# Altium footprint library ST封装.PcbLib: 1336 footprints (part 99 of 109)
Each footprint in its own frame and in the unit in brackets; x right, y up, seen from the top. Pads: shape width x height; smd on the part's side, far side on the other; paste and mask are expansions set on the pad; w line width, h text height; cw(c..) or ccw(c..) is an arc to the next point about the centre after c.
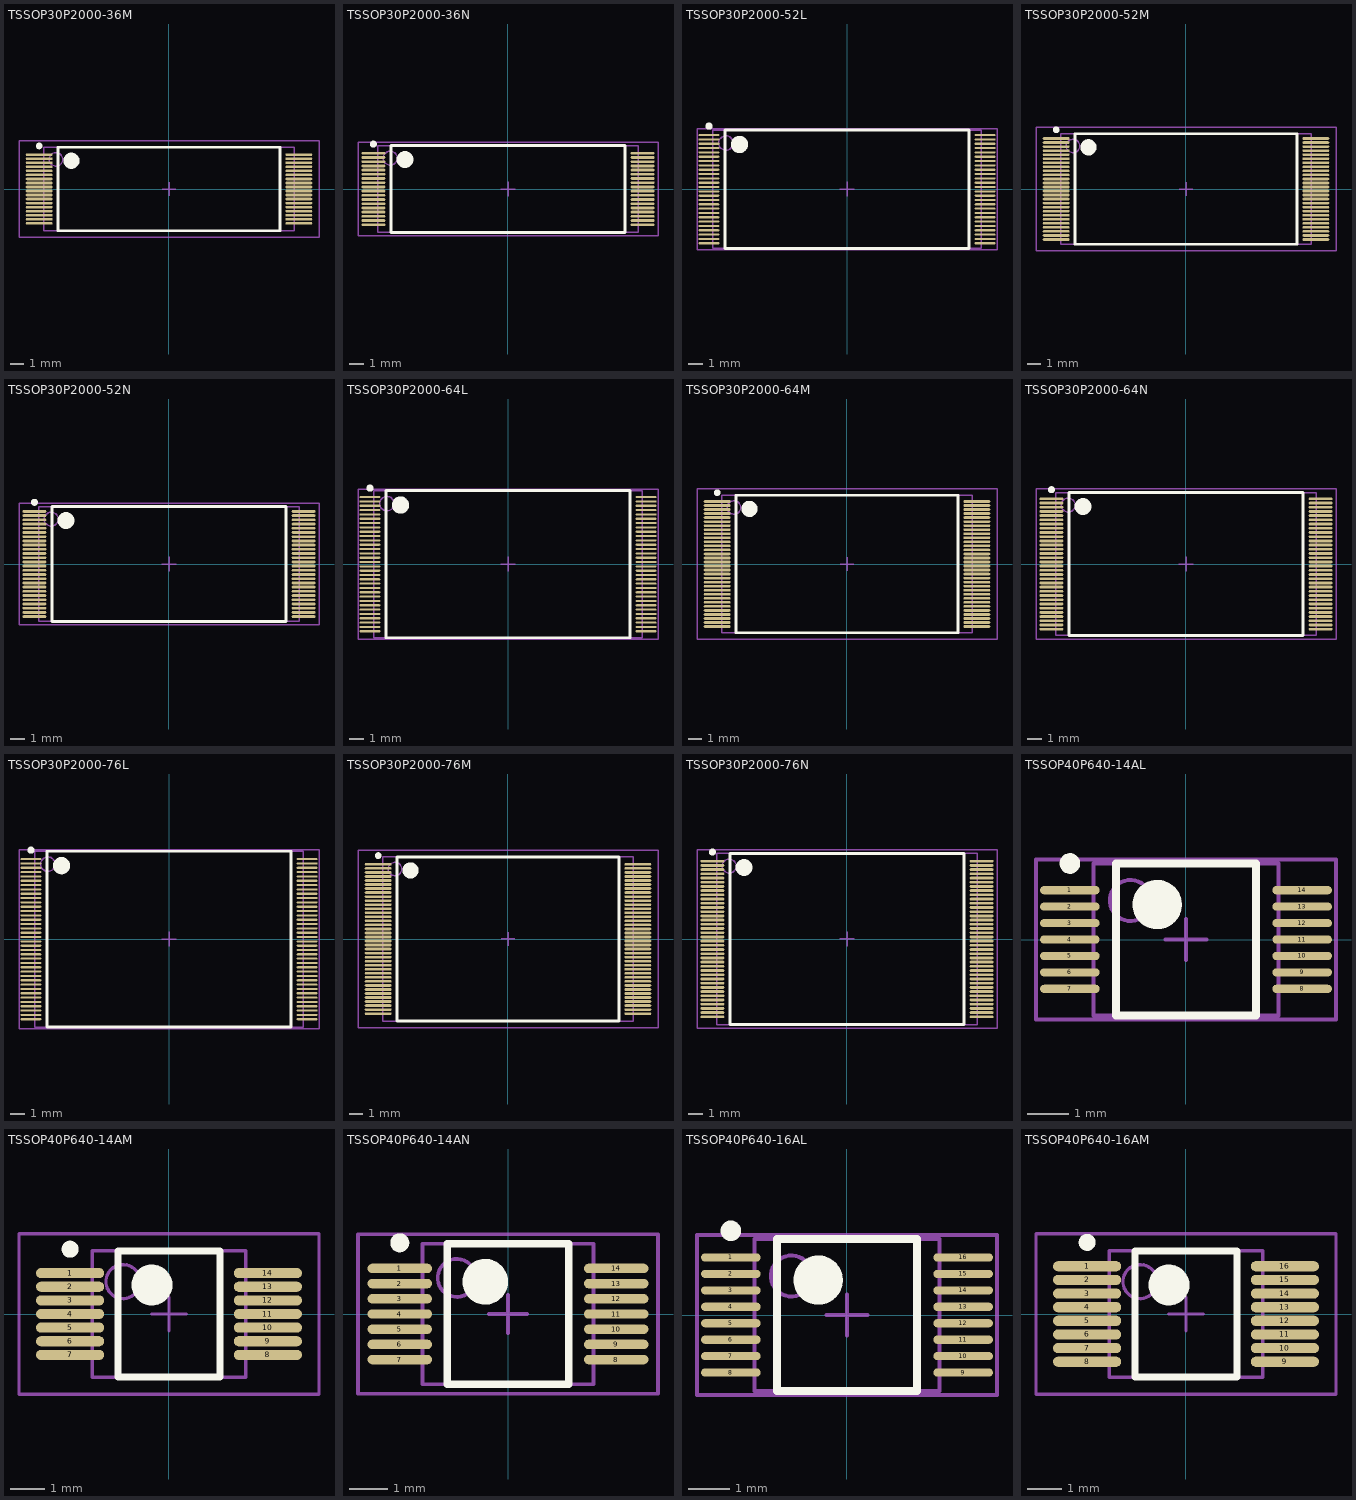
[diagram p98: the footprints below, top view; thin cyan lines are the x and y axes]

## TSSOP30P2000-36M [mm] "TSSOP, 36-Leads, Body 6.2x18.6mm; Pitch 0.3mm, IPC Low Density"
height 1.27
pads (36):
  oval 2x0.2 smd: 1(-9.65,2.55) 2(-9.65,2.25) 3(-9.65,1.95) 4(-9.65,1.65) 5(-9.65,1.35) 6(-9.65,1.05) 7(-9.65,0.75) 8(-9.65,0.45) 9(-9.65,0.15) 10(-9.65,-0.15) 11(-9.65,-0.45) 12(-9.65,-0.75) 13(-9.65,-1.05) 14(-9.65,-1.35) 15(-9.65,-1.65) 16(-9.65,-1.95) 17(-9.65,-2.25) 18(-9.65,-2.55) 19(9.65,-2.55) 20(9.65,-2.25) 21(9.65,-1.95) 22(9.65,-1.65) 23(9.65,-1.35) 24(9.65,-1.05) 25(9.65,-0.75) 26(9.65,-0.45) 27(9.65,-0.15) 28(9.65,0.15) 29(9.65,0.45) 30(9.65,0.75) 31(9.65,1.05) 32(9.65,1.35) 33(9.65,1.65) 34(9.65,1.95) 35(9.65,2.25) 36(9.65,2.55)
Top Overlay:
  circle w0.6: c-7.25,2.1 r0.3
  circle w0.25: c-9.65,3.2 r0.125
  lines w0.2: -8.25,-3.1 8.25,-3.1 8.25,3.1 -8.25,3.1 -8.25,-3.1
Mechanical 13:
  circle w0.1: c-8.4,2.2 r0.5
  lines w0.1: -9.3,-3.1 9.3,-3.1 9.3,3.1 -9.3,3.1 -9.3,-3.1
Mechanical 15:
  lines w0.1: -0.5,0 0.5,0 ; 0,-0.5 0,0.5 ; -11.15,-3.6 11.15,-3.6 11.15,3.6 -11.15,3.6 -11.15,-3.6
3D body: height 1.27, standoff 0, extent -9.3,-3.1 9.3,3.1

## TSSOP30P2000-36N [mm] "TSSOP, 36-Leads, Body 6.2x18.6mm; Pitch 0.3mm, IPC Medium Density"
height 1.27
pads (36):
  oval 1.7x0.2 smd: 1(-9.6,2.55) 2(-9.6,2.25) 3(-9.6,1.95) 4(-9.6,1.65) 5(-9.6,1.35) 6(-9.6,1.05) 7(-9.6,0.75) 8(-9.6,0.45) 9(-9.6,0.15) 10(-9.6,-0.15) 11(-9.6,-0.45) 12(-9.6,-0.75) 13(-9.6,-1.05) 14(-9.6,-1.35) 15(-9.6,-1.65) 16(-9.6,-1.95) 17(-9.6,-2.25) 18(-9.6,-2.55) 19(9.6,-2.55) 20(9.6,-2.25) 21(9.6,-1.95) 22(9.6,-1.65) 23(9.6,-1.35) 24(9.6,-1.05) 25(9.6,-0.75) 26(9.6,-0.45) 27(9.6,-0.15) 28(9.6,0.15) 29(9.6,0.45) 30(9.6,0.75) 31(9.6,1.05) 32(9.6,1.35) 33(9.6,1.65) 34(9.6,1.95) 35(9.6,2.25) 36(9.6,2.55)
Top Overlay:
  circle w0.25: c-9.6,3.2 r0.125
  circle w0.6: c-7.35,2.1 r0.3
  lines w0.2: -8.35,-3.1 -8.35,3.1 8.35,3.1 8.35,-3.1 -8.35,-3.1
Mechanical 13:
  circle w0.1: c-8.4,2.2 r0.5
  lines w0.1: -9.3,-3.1 -9.3,3.1 9.3,3.1 9.3,-3.1 -9.3,-3.1
Mechanical 15:
  lines w0.1: -0.5,0 0.5,0 ; 0,-0.5 0,0.5 ; -10.7,-3.35 -10.7,3.35 10.7,3.35 10.7,-3.35 -10.7,-3.35
3D body: height 1.27, standoff 0, extent -9.3,-3.1 9.3,3.1

## TSSOP30P2000-52L [mm] "TSSOP, 52-Leads, Body 8.2x18.6mm; Pitch 0.3mm, IPC High Density"
height 1.27
pads (52):
  oval 1.45x0.15 smd: 1(-9.575,3.75) 2(-9.575,3.45) 3(-9.575,3.15) 4(-9.575,2.85) 5(-9.575,2.55) 6(-9.575,2.25) 7(-9.575,1.95) 8(-9.575,1.65) 9(-9.575,1.35) 10(-9.575,1.05) 11(-9.575,0.75) 12(-9.575,0.45) 13(-9.575,0.15) 14(-9.575,-0.15) 15(-9.575,-0.45) 16(-9.575,-0.75) 17(-9.575,-1.05) 18(-9.575,-1.35) 19(-9.575,-1.65) 20(-9.575,-1.95) 21(-9.575,-2.25) 22(-9.575,-2.55) 23(-9.575,-2.85) 24(-9.575,-3.15) 25(-9.575,-3.45) 26(-9.575,-3.75) 27(9.575,-3.75) 28(9.575,-3.45) 29(9.575,-3.15) 30(9.575,-2.85) 31(9.575,-2.55) 32(9.575,-2.25) 33(9.575,-1.95) 34(9.575,-1.65) 35(9.575,-1.35) 36(9.575,-1.05) 37(9.575,-0.75) 38(9.575,-0.45) 39(9.575,-0.15) 40(9.575,0.15) 41(9.575,0.45) 42(9.575,0.75) 43(9.575,1.05) 44(9.575,1.35) 45(9.575,1.65) 46(9.575,1.95) 47(9.575,2.25) 48(9.575,2.55) 49(9.575,2.85) 50(9.575,3.15) 51(9.575,3.45) 52(9.575,3.75)
Top Overlay:
  circle w0.6: c-7.45,3.1 r0.3
  circle w0.25: c-9.575,4.375 r0.125
  lines w0.2: -8.45,-4.1 8.45,-4.1 8.45,4.1 -8.45,4.1 -8.45,-4.1
Mechanical 13:
  circle w0.1: c-8.4,3.2 r0.5
  lines w0.1: -9.3,-4.1 9.3,-4.1 9.3,4.1 -9.3,4.1 -9.3,-4.1
Mechanical 15:
  lines w0.1: -0.5,0 0.5,0 ; 0,-0.5 0,0.5 ; -10.4,-4.2 10.4,-4.2 10.4,4.2 -10.4,4.2 -10.4,-4.2
3D body: height 1.27, standoff 0, extent -9.3,-4.1 9.3,4.1

## TSSOP30P2000-52M [mm] "TSSOP, 52-Leads, Body 8.2x18.6mm; Pitch 0.3mm, IPC Low Density"
height 1.27
pads (52):
  oval 2x0.2 smd: 1(-9.65,3.75) 2(-9.65,3.45) 3(-9.65,3.15) 4(-9.65,2.85) 5(-9.65,2.55) 6(-9.65,2.25) 7(-9.65,1.95) 8(-9.65,1.65) 9(-9.65,1.35) 10(-9.65,1.05) 11(-9.65,0.75) 12(-9.65,0.45) 13(-9.65,0.15) 14(-9.65,-0.15) 15(-9.65,-0.45) 16(-9.65,-0.75) 17(-9.65,-1.05) 18(-9.65,-1.35) 19(-9.65,-1.65) 20(-9.65,-1.95) 21(-9.65,-2.25) 22(-9.65,-2.55) 23(-9.65,-2.85) 24(-9.65,-3.15) 25(-9.65,-3.45) 26(-9.65,-3.75) 27(9.65,-3.75) 28(9.65,-3.45) 29(9.65,-3.15) 30(9.65,-2.85) 31(9.65,-2.55) 32(9.65,-2.25) 33(9.65,-1.95) 34(9.65,-1.65) 35(9.65,-1.35) 36(9.65,-1.05) 37(9.65,-0.75) 38(9.65,-0.45) 39(9.65,-0.15) 40(9.65,0.15) 41(9.65,0.45) 42(9.65,0.75) 43(9.65,1.05) 44(9.65,1.35) 45(9.65,1.65) 46(9.65,1.95) 47(9.65,2.25) 48(9.65,2.55) 49(9.65,2.85) 50(9.65,3.15) 51(9.65,3.45) 52(9.65,3.75)
Top Overlay:
  circle w0.6: c-7.25,3.1 r0.3
  circle w0.25: c-9.65,4.4 r0.125
  lines w0.2: -8.25,-4.1 8.25,-4.1 8.25,4.1 -8.25,4.1 -8.25,-4.1
Mechanical 13:
  circle w0.1: c-8.4,3.2 r0.5
  lines w0.1: -9.3,-4.1 9.3,-4.1 9.3,4.1 -9.3,4.1 -9.3,-4.1
Mechanical 15:
  lines w0.1: -0.5,0 0.5,0 ; 0,-0.5 0,0.5 ; -11.15,-4.6 11.15,-4.6 11.15,4.6 -11.15,4.6 -11.15,-4.6
3D body: height 1.27, standoff 0, extent -9.3,-4.1 9.3,4.1

## TSSOP30P2000-52N [mm] "TSSOP, 52-Leads, Body 8.2x18.6mm; Pitch 0.3mm, IPC Medium Density"
height 1.27
pads (52):
  oval 1.7x0.2 smd: 1(-9.6,3.75) 2(-9.6,3.45) 3(-9.6,3.15) 4(-9.6,2.85) 5(-9.6,2.55) 6(-9.6,2.25) 7(-9.6,1.95) 8(-9.6,1.65) 9(-9.6,1.35) 10(-9.6,1.05) 11(-9.6,0.75) 12(-9.6,0.45) 13(-9.6,0.15) 14(-9.6,-0.15) 15(-9.6,-0.45) 16(-9.6,-0.75) 17(-9.6,-1.05) 18(-9.6,-1.35) 19(-9.6,-1.65) 20(-9.6,-1.95) 21(-9.6,-2.25) 22(-9.6,-2.55) 23(-9.6,-2.85) 24(-9.6,-3.15) 25(-9.6,-3.45) 26(-9.6,-3.75) 27(9.6,-3.75) 28(9.6,-3.45) 29(9.6,-3.15) 30(9.6,-2.85) 31(9.6,-2.55) 32(9.6,-2.25) 33(9.6,-1.95) 34(9.6,-1.65) 35(9.6,-1.35) 36(9.6,-1.05) 37(9.6,-0.75) 38(9.6,-0.45) 39(9.6,-0.15) 40(9.6,0.15) 41(9.6,0.45) 42(9.6,0.75) 43(9.6,1.05) 44(9.6,1.35) 45(9.6,1.65) 46(9.6,1.95) 47(9.6,2.25) 48(9.6,2.55) 49(9.6,2.85) 50(9.6,3.15) 51(9.6,3.45) 52(9.6,3.75)
Top Overlay:
  circle w0.25: c-9.6,4.4 r0.125
  circle w0.6: c-7.35,3.1 r0.3
  lines w0.2: -8.35,-4.1 -8.35,4.1 8.35,4.1 8.35,-4.1 -8.35,-4.1
Mechanical 13:
  circle w0.1: c-8.4,3.2 r0.5
  lines w0.1: -9.3,-4.1 -9.3,4.1 9.3,4.1 9.3,-4.1 -9.3,-4.1
Mechanical 15:
  lines w0.1: -0.5,0 0.5,0 ; 0,-0.5 0,0.5 ; -10.7,-4.35 -10.7,4.35 10.7,4.35 10.7,-4.35 -10.7,-4.35
3D body: height 1.27, standoff 0, extent -9.3,-4.1 9.3,4.1

## TSSOP30P2000-64L [mm] "TSSOP, 64-Leads, Body 10.2x18.6mm; Pitch 0.3mm, IPC High Density"
height 1.27
pads (64):
  oval 1.45x0.15 smd: 1(-9.575,4.65) 2(-9.575,4.35) 3(-9.575,4.05) 4(-9.575,3.75) 5(-9.575,3.45) 6(-9.575,3.15) 7(-9.575,2.85) 8(-9.575,2.55) 9(-9.575,2.25) 10(-9.575,1.95) 11(-9.575,1.65) 12(-9.575,1.35) 13(-9.575,1.05) 14(-9.575,0.75) 15(-9.575,0.45) 16(-9.575,0.15) 17(-9.575,-0.15) 18(-9.575,-0.45) 19(-9.575,-0.75) 20(-9.575,-1.05) 21(-9.575,-1.35) 22(-9.575,-1.65) 23(-9.575,-1.95) 24(-9.575,-2.25) 25(-9.575,-2.55) 26(-9.575,-2.85) 27(-9.575,-3.15) 28(-9.575,-3.45) 29(-9.575,-3.75) 30(-9.575,-4.05) 31(-9.575,-4.35) 32(-9.575,-4.65) 33(9.575,-4.65) 34(9.575,-4.35) 35(9.575,-4.05) 36(9.575,-3.75) 37(9.575,-3.45) 38(9.575,-3.15) 39(9.575,-2.85) 40(9.575,-2.55) 41(9.575,-2.25) 42(9.575,-1.95) 43(9.575,-1.65) 44(9.575,-1.35) 45(9.575,-1.05) 46(9.575,-0.75) 47(9.575,-0.45) 48(9.575,-0.15) 49(9.575,0.15) 50(9.575,0.45) 51(9.575,0.75) 52(9.575,1.05) 53(9.575,1.35) 54(9.575,1.65) 55(9.575,1.95) 56(9.575,2.25) 57(9.575,2.55) 58(9.575,2.85) 59(9.575,3.15) 60(9.575,3.45) 61(9.575,3.75) 62(9.575,4.05) 63(9.575,4.35) 64(9.575,4.65)
Top Overlay:
  circle w0.25: c-9.575,5.275 r0.125
  circle w0.6: c-7.45,4.1 r0.3
  lines w0.2: -8.45,-5.1 -8.45,5.1 8.45,5.1 8.45,-5.1 -8.45,-5.1
Mechanical 13:
  circle w0.1: c-8.4,4.2 r0.5
  lines w0.1: -9.3,-5.1 -9.3,5.1 9.3,5.1 9.3,-5.1 -9.3,-5.1
Mechanical 15:
  lines w0.1: -0.5,0 0.5,0 ; 0,-0.5 0,0.5 ; -10.4,-5.2 -10.4,5.2 10.4,5.2 10.4,-5.2 -10.4,-5.2
3D body: height 1.27, standoff 0, extent -9.3,-5.1 9.3,5.1

## TSSOP30P2000-64M [mm] "TSSOP, 64-Leads, Body 10.2x18.6mm; Pitch 0.3mm, IPC Low Density"
height 1.27
pads (64):
  oval 2x0.2 smd: 1(-9.65,4.65) 2(-9.65,4.35) 3(-9.65,4.05) 4(-9.65,3.75) 5(-9.65,3.45) 6(-9.65,3.15) 7(-9.65,2.85) 8(-9.65,2.55) 9(-9.65,2.25) 10(-9.65,1.95) 11(-9.65,1.65) 12(-9.65,1.35) 13(-9.65,1.05) 14(-9.65,0.75) 15(-9.65,0.45) 16(-9.65,0.15) 17(-9.65,-0.15) 18(-9.65,-0.45) 19(-9.65,-0.75) 20(-9.65,-1.05) 21(-9.65,-1.35) 22(-9.65,-1.65) 23(-9.65,-1.95) 24(-9.65,-2.25) 25(-9.65,-2.55) 26(-9.65,-2.85) 27(-9.65,-3.15) 28(-9.65,-3.45) 29(-9.65,-3.75) 30(-9.65,-4.05) 31(-9.65,-4.35) 32(-9.65,-4.65) 33(9.65,-4.65) 34(9.65,-4.35) 35(9.65,-4.05) 36(9.65,-3.75) 37(9.65,-3.45) 38(9.65,-3.15) 39(9.65,-2.85) 40(9.65,-2.55) 41(9.65,-2.25) 42(9.65,-1.95) 43(9.65,-1.65) 44(9.65,-1.35) 45(9.65,-1.05) 46(9.65,-0.75) 47(9.65,-0.45) 48(9.65,-0.15) 49(9.65,0.15) 50(9.65,0.45) 51(9.65,0.75) 52(9.65,1.05) 53(9.65,1.35) 54(9.65,1.65) 55(9.65,1.95) 56(9.65,2.25) 57(9.65,2.55) 58(9.65,2.85) 59(9.65,3.15) 60(9.65,3.45) 61(9.65,3.75) 62(9.65,4.05) 63(9.65,4.35) 64(9.65,4.65)
Top Overlay:
  circle w0.6: c-7.25,4.1 r0.3
  circle w0.25: c-9.65,5.3 r0.125
  lines w0.2: -8.25,-5.1 8.25,-5.1 8.25,5.1 -8.25,5.1 -8.25,-5.1
Mechanical 13:
  circle w0.1: c-8.4,4.2 r0.5
  lines w0.1: -9.3,-5.1 9.3,-5.1 9.3,5.1 -9.3,5.1 -9.3,-5.1
Mechanical 15:
  lines w0.1: -0.5,0 0.5,0 ; 0,-0.5 0,0.5 ; -11.15,-5.6 11.15,-5.6 11.15,5.6 -11.15,5.6 -11.15,-5.6
3D body: height 1.27, standoff 0, extent -9.3,-5.1 9.3,5.1

## TSSOP30P2000-64N [mm] "TSSOP, 64-Leads, Body 10.2x18.6mm; Pitch 0.3mm, IPC Medium Density"
height 1.27
pads (64):
  oval 1.7x0.2 smd: 1(-9.6,4.65) 2(-9.6,4.35) 3(-9.6,4.05) 4(-9.6,3.75) 5(-9.6,3.45) 6(-9.6,3.15) 7(-9.6,2.85) 8(-9.6,2.55) 9(-9.6,2.25) 10(-9.6,1.95) 11(-9.6,1.65) 12(-9.6,1.35) 13(-9.6,1.05) 14(-9.6,0.75) 15(-9.6,0.45) 16(-9.6,0.15) 17(-9.6,-0.15) 18(-9.6,-0.45) 19(-9.6,-0.75) 20(-9.6,-1.05) 21(-9.6,-1.35) 22(-9.6,-1.65) 23(-9.6,-1.95) 24(-9.6,-2.25) 25(-9.6,-2.55) 26(-9.6,-2.85) 27(-9.6,-3.15) 28(-9.6,-3.45) 29(-9.6,-3.75) 30(-9.6,-4.05) 31(-9.6,-4.35) 32(-9.6,-4.65) 33(9.6,-4.65) 34(9.6,-4.35) 35(9.6,-4.05) 36(9.6,-3.75) 37(9.6,-3.45) 38(9.6,-3.15) 39(9.6,-2.85) 40(9.6,-2.55) 41(9.6,-2.25) 42(9.6,-1.95) 43(9.6,-1.65) 44(9.6,-1.35) 45(9.6,-1.05) 46(9.6,-0.75) 47(9.6,-0.45) 48(9.6,-0.15) 49(9.6,0.15) 50(9.6,0.45) 51(9.6,0.75) 52(9.6,1.05) 53(9.6,1.35) 54(9.6,1.65) 55(9.6,1.95) 56(9.6,2.25) 57(9.6,2.55) 58(9.6,2.85) 59(9.6,3.15) 60(9.6,3.45) 61(9.6,3.75) 62(9.6,4.05) 63(9.6,4.35) 64(9.6,4.65)
Top Overlay:
  circle w0.25: c-9.6,5.3 r0.125
  circle w0.6: c-7.35,4.1 r0.3
  lines w0.2: -8.35,-5.1 -8.35,5.1 8.35,5.1 8.35,-5.1 -8.35,-5.1
Mechanical 13:
  circle w0.1: c-8.4,4.2 r0.5
  lines w0.1: -9.3,-5.1 -9.3,5.1 9.3,5.1 9.3,-5.1 -9.3,-5.1
Mechanical 15:
  lines w0.1: -0.5,0 0.5,0 ; 0,-0.5 0,0.5 ; -10.7,-5.35 -10.7,5.35 10.7,5.35 10.7,-5.35 -10.7,-5.35
3D body: height 1.27, standoff 0, extent -9.3,-5.1 9.3,5.1

## TSSOP30P2000-76L [mm] "TSSOP, 76-Leads, Body 12.2x18.6mm; Pitch 0.3mm, IPC High Density"
height 1.27
pads (76):
  oval 1.45x0.15 smd: 1(-9.575,5.55) 2(-9.575,5.25) 3(-9.575,4.95) 4(-9.575,4.65) 5(-9.575,4.35) 6(-9.575,4.05) 7(-9.575,3.75) 8(-9.575,3.45) 9(-9.575,3.15) 10(-9.575,2.85) 11(-9.575,2.55) 12(-9.575,2.25) 13(-9.575,1.95) 14(-9.575,1.65) 15(-9.575,1.35) 16(-9.575,1.05) 17(-9.575,0.75) 18(-9.575,0.45) 19(-9.575,0.15) 20(-9.575,-0.15) 21(-9.575,-0.45) 22(-9.575,-0.75) 23(-9.575,-1.05) 24(-9.575,-1.35) 25(-9.575,-1.65) 26(-9.575,-1.95) 27(-9.575,-2.25) 28(-9.575,-2.55) 29(-9.575,-2.85) 30(-9.575,-3.15) 31(-9.575,-3.45) 32(-9.575,-3.75) 33(-9.575,-4.05) 34(-9.575,-4.35) 35(-9.575,-4.65) 36(-9.575,-4.95) 37(-9.575,-5.25) 38(-9.575,-5.55) 39(9.575,-5.55) 40(9.575,-5.25) 41(9.575,-4.95) 42(9.575,-4.65) 43(9.575,-4.35) 44(9.575,-4.05) 45(9.575,-3.75) 46(9.575,-3.45) 47(9.575,-3.15) 48(9.575,-2.85) 49(9.575,-2.55) 50(9.575,-2.25) 51(9.575,-1.95) 52(9.575,-1.65) 53(9.575,-1.35) 54(9.575,-1.05) 55(9.575,-0.75) 56(9.575,-0.45) 57(9.575,-0.15) 58(9.575,0.15) 59(9.575,0.45) 60(9.575,0.75) 61(9.575,1.05) 62(9.575,1.35) 63(9.575,1.65) 64(9.575,1.95) 65(9.575,2.25) 66(9.575,2.55) 67(9.575,2.85) 68(9.575,3.15) 69(9.575,3.45) 70(9.575,3.75) 71(9.575,4.05) 72(9.575,4.35) 73(9.575,4.65) 74(9.575,4.95) 75(9.575,5.25) 76(9.575,5.55)
Top Overlay:
  circle w0.6: c-7.45,5.1 r0.3
  circle w0.25: c-9.575,6.175 r0.125
  lines w0.2: -8.45,-6.1 8.45,-6.1 8.45,6.1 -8.45,6.1 -8.45,-6.1
Mechanical 13:
  circle w0.1: c-8.4,5.2 r0.5
  lines w0.1: -9.3,-6.1 9.3,-6.1 9.3,6.1 -9.3,6.1 -9.3,-6.1
Mechanical 15:
  lines w0.1: -0.5,0 0.5,0 ; 0,-0.5 0,0.5 ; -10.4,-6.2 10.4,-6.2 10.4,6.2 -10.4,6.2 -10.4,-6.2
3D body: height 1.27, standoff 0, extent -9.3,-6.1 9.3,6.1

## TSSOP30P2000-76M [mm] "TSSOP, 76-Leads, Body 12.2x18.6mm; Pitch 0.3mm, IPC Low Density"
height 1.27
pads (76):
  oval 2x0.2 smd: 1(-9.65,5.55) 2(-9.65,5.25) 3(-9.65,4.95) 4(-9.65,4.65) 5(-9.65,4.35) 6(-9.65,4.05) 7(-9.65,3.75) 8(-9.65,3.45) 9(-9.65,3.15) 10(-9.65,2.85) 11(-9.65,2.55) 12(-9.65,2.25) 13(-9.65,1.95) 14(-9.65,1.65) 15(-9.65,1.35) 16(-9.65,1.05) 17(-9.65,0.75) 18(-9.65,0.45) 19(-9.65,0.15) 20(-9.65,-0.15) 21(-9.65,-0.45) 22(-9.65,-0.75) 23(-9.65,-1.05) 24(-9.65,-1.35) 25(-9.65,-1.65) 26(-9.65,-1.95) 27(-9.65,-2.25) 28(-9.65,-2.55) 29(-9.65,-2.85) 30(-9.65,-3.15) 31(-9.65,-3.45) 32(-9.65,-3.75) 33(-9.65,-4.05) 34(-9.65,-4.35) 35(-9.65,-4.65) 36(-9.65,-4.95) 37(-9.65,-5.25) 38(-9.65,-5.55) 39(9.65,-5.55) 40(9.65,-5.25) 41(9.65,-4.95) 42(9.65,-4.65) 43(9.65,-4.35) 44(9.65,-4.05) 45(9.65,-3.75) 46(9.65,-3.45) 47(9.65,-3.15) 48(9.65,-2.85) 49(9.65,-2.55) 50(9.65,-2.25) 51(9.65,-1.95) 52(9.65,-1.65) 53(9.65,-1.35) 54(9.65,-1.05) 55(9.65,-0.75) 56(9.65,-0.45) 57(9.65,-0.15) 58(9.65,0.15) 59(9.65,0.45) 60(9.65,0.75) 61(9.65,1.05) 62(9.65,1.35) 63(9.65,1.65) 64(9.65,1.95) 65(9.65,2.25) 66(9.65,2.55) 67(9.65,2.85) 68(9.65,3.15) 69(9.65,3.45) 70(9.65,3.75) 71(9.65,4.05) 72(9.65,4.35) 73(9.65,4.65) 74(9.65,4.95) 75(9.65,5.25) 76(9.65,5.55)
Top Overlay:
  circle w0.6: c-7.25,5.1 r0.3
  circle w0.25: c-9.65,6.2 r0.125
  lines w0.2: -8.25,-6.1 8.25,-6.1 8.25,6.1 -8.25,6.1 -8.25,-6.1
Mechanical 13:
  circle w0.1: c-8.4,5.2 r0.5
  lines w0.1: -9.3,-6.1 9.3,-6.1 9.3,6.1 -9.3,6.1 -9.3,-6.1
Mechanical 15:
  lines w0.1: -0.5,0 0.5,0 ; 0,-0.5 0,0.5 ; -11.15,-6.6 11.15,-6.6 11.15,6.6 -11.15,6.6 -11.15,-6.6
3D body: height 1.27, standoff 0, extent -9.3,-6.1 9.3,6.1

## TSSOP30P2000-76N [mm] "TSSOP, 76-Leads, Body 12.2x18.6mm; Pitch 0.3mm, IPC Medium Density"
height 1.27
pads (76):
  oval 1.7x0.2 smd: 1(-9.6,5.55) 2(-9.6,5.25) 3(-9.6,4.95) 4(-9.6,4.65) 5(-9.6,4.35) 6(-9.6,4.05) 7(-9.6,3.75) 8(-9.6,3.45) 9(-9.6,3.15) 10(-9.6,2.85) 11(-9.6,2.55) 12(-9.6,2.25) 13(-9.6,1.95) 14(-9.6,1.65) 15(-9.6,1.35) 16(-9.6,1.05) 17(-9.6,0.75) 18(-9.6,0.45) 19(-9.6,0.15) 20(-9.6,-0.15) 21(-9.6,-0.45) 22(-9.6,-0.75) 23(-9.6,-1.05) 24(-9.6,-1.35) 25(-9.6,-1.65) 26(-9.6,-1.95) 27(-9.6,-2.25) 28(-9.6,-2.55) 29(-9.6,-2.85) 30(-9.6,-3.15) 31(-9.6,-3.45) 32(-9.6,-3.75) 33(-9.6,-4.05) 34(-9.6,-4.35) 35(-9.6,-4.65) 36(-9.6,-4.95) 37(-9.6,-5.25) 38(-9.6,-5.55) 39(9.6,-5.55) 40(9.6,-5.25) 41(9.6,-4.95) 42(9.6,-4.65) 43(9.6,-4.35) 44(9.6,-4.05) 45(9.6,-3.75) 46(9.6,-3.45) 47(9.6,-3.15) 48(9.6,-2.85) 49(9.6,-2.55) 50(9.6,-2.25) 51(9.6,-1.95) 52(9.6,-1.65) 53(9.6,-1.35) 54(9.6,-1.05) 55(9.6,-0.75) 56(9.6,-0.45) 57(9.6,-0.15) 58(9.6,0.15) 59(9.6,0.45) 60(9.6,0.75) 61(9.6,1.05) 62(9.6,1.35) 63(9.6,1.65) 64(9.6,1.95) 65(9.6,2.25) 66(9.6,2.55) 67(9.6,2.85) 68(9.6,3.15) 69(9.6,3.45) 70(9.6,3.75) 71(9.6,4.05) 72(9.6,4.35) 73(9.6,4.65) 74(9.6,4.95) 75(9.6,5.25) 76(9.6,5.55)
Top Overlay:
  circle w0.6: c-7.35,5.1 r0.3
  circle w0.25: c-9.6,6.2 r0.125
  lines w0.2: -8.35,-6.1 8.35,-6.1 8.35,6.1 -8.35,6.1 -8.35,-6.1
Mechanical 13:
  circle w0.1: c-8.4,5.2 r0.5
  lines w0.1: -9.3,-6.1 9.3,-6.1 9.3,6.1 -9.3,6.1 -9.3,-6.1
Mechanical 15:
  lines w0.1: -0.5,0 0.5,0 ; 0,-0.5 0,0.5 ; -10.7,-6.35 10.7,-6.35 10.7,6.35 -10.7,6.35 -10.7,-6.35
3D body: height 1.27, standoff 0, extent -9.3,-6.1 9.3,6.1

## TSSOP40P640-14AL [mm] "TSSOP, 14-Leads, Body 3.6x4.4mm, Pitch 0.4mm, IPC High Density"
height 1.2
pads (14):
  oval 1.45x0.2 smd: 1(-2.825,1.2) 2(-2.825,0.8) 3(-2.825,0.4) 4(-2.825,0) 5(-2.825,-0.4) 6(-2.825,-0.8) 7(-2.825,-1.2) 8(2.825,-1.2) 9(2.825,-0.8) 10(2.825,-0.4) 11(2.825,0) 12(2.825,0.4) 13(2.825,0.8) 14(2.825,1.2)
Top Overlay:
  circle w0.6: c-0.7,0.85 r0.3
  circle w0.25: c-2.825,1.85 r0.125
  lines w0.2: -1.7,-1.85 1.7,-1.85 1.7,1.85 -1.7,1.85 -1.7,-1.85
Mechanical 13:
  circle w0.1: c-1.35,0.95 r0.5
  lines w0.1: -2.25,-1.85 2.25,-1.85 2.25,1.85 -2.25,1.85 -2.25,-1.85
Mechanical 15:
  lines w0.1: -0.5,0 0.5,0 ; 0,-0.5 0,0.5 ; -3.65,-1.95 3.65,-1.95 3.65,1.95 -3.65,1.95 -3.65,-1.95
3D body: height 1.2, standoff 0, extent -2.25,-1.85 2.25,1.85

## TSSOP40P640-14AM [mm] "TSSOP, 14-Leads, Body 3.6x4.4mm, Pitch 0.4mm, IPC Low Density"
height 1.2
pads (14):
  oval 2x0.3 smd: 1(-2.9,1.2) 2(-2.9,0.8) 3(-2.9,0.4) 4(-2.9,0) 5(-2.9,-0.4) 6(-2.9,-0.8) 7(-2.9,-1.2) 8(2.9,-1.2) 9(2.9,-0.8) 10(2.9,-0.4) 11(2.9,0) 12(2.9,0.4) 13(2.9,0.8) 14(2.9,1.2)
Top Overlay:
  circle w0.25: c-2.9,1.9 r0.125
  circle w0.6: c-0.5,0.85 r0.3
  lines w0.2: -1.5,-1.85 -1.5,1.85 1.5,1.85 1.5,-1.85 -1.5,-1.85
Mechanical 13:
  circle w0.1: c-1.35,0.95 r0.5
  lines w0.1: -2.25,-1.85 -2.25,1.85 2.25,1.85 2.25,-1.85 -2.25,-1.85
Mechanical 15:
  lines w0.1: -0.5,0 0.5,0 ; 0,-0.5 0,0.5 ; -4.4,-2.35 -4.4,2.35 4.4,2.35 4.4,-2.35 -4.4,-2.35
3D body: height 1.2, standoff 0, extent -2.25,-1.85 2.25,1.85

## TSSOP40P640-14AN [mm] "TSSOP, 14-Leads, Body 3.6x4.4mm, Pitch 0.4mm, IPC Medium Density"
height 1.2
pads (14):
  oval 1.7x0.25 smd: 1(-2.85,1.2) 2(-2.85,0.8) 3(-2.85,0.4) 4(-2.85,0) 5(-2.85,-0.4) 6(-2.85,-0.8) 7(-2.85,-1.2) 8(2.85,-1.2) 9(2.85,-0.8) 10(2.85,-0.4) 11(2.85,0) 12(2.85,0.4) 13(2.85,0.8) 14(2.85,1.2)
Top Overlay:
  circle w0.25: c-2.85,1.875 r0.125
  circle w0.6: c-0.6,0.85 r0.3
  lines w0.2: -1.6,-1.85 -1.6,1.85 1.6,1.85 1.6,-1.85 -1.6,-1.85
Mechanical 13:
  circle w0.1: c-1.35,0.95 r0.5
  lines w0.1: -2.25,-1.85 -2.25,1.85 2.25,1.85 2.25,-1.85 -2.25,-1.85
Mechanical 15:
  lines w0.1: -0.5,0 0.5,0 ; 0,-0.5 0,0.5 ; -3.95,-2.1 -3.95,2.1 3.95,2.1 3.95,-2.1 -3.95,-2.1
3D body: height 1.2, standoff 0, extent -2.25,-1.85 2.25,1.85

## TSSOP40P640-16AL [mm] "TSSOP, 16-Leads, Body 3.6x4.4mm, Pitch 0.4mm, IPC High Density"
height 1.2
pads (16):
  oval 1.45x0.2 smd: 1(-2.825,1.4) 2(-2.825,1) 3(-2.825,0.6) 4(-2.825,0.2) 5(-2.825,-0.2) 6(-2.825,-0.6) 7(-2.825,-1) 8(-2.825,-1.4) 9(2.825,-1.4) 10(2.825,-1) 11(2.825,-0.6) 12(2.825,-0.2) 13(2.825,0.2) 14(2.825,0.6) 15(2.825,1) 16(2.825,1.4)
Top Overlay:
  circle w0.6: c-0.7,0.85 r0.3
  circle w0.25: c-2.825,2.05 r0.125
  lines w0.2: -1.7,-1.85 1.7,-1.85 1.7,1.85 -1.7,1.85 -1.7,-1.85
Mechanical 13:
  circle w0.1: c-1.35,0.95 r0.5
  lines w0.1: -2.25,-1.85 2.25,-1.85 2.25,1.85 -2.25,1.85 -2.25,-1.85
Mechanical 15:
  lines w0.1: -0.5,0 0.5,0 ; 0,-0.5 0,0.5 ; -3.65,-1.95 3.65,-1.95 3.65,1.95 -3.65,1.95 -3.65,-1.95
3D body: height 1.2, standoff 0, extent -2.25,-1.85 2.25,1.85

## TSSOP40P640-16AM [mm] "TSSOP, 16-Leads, Body 3.6x4.4mm, Pitch 0.4mm, IPC Low Density"
height 1.2
pads (16):
  oval 2x0.3 smd: 1(-2.9,1.4) 2(-2.9,1) 3(-2.9,0.6) 4(-2.9,0.2) 5(-2.9,-0.2) 6(-2.9,-0.6) 7(-2.9,-1) 8(-2.9,-1.4) 9(2.9,-1.4) 10(2.9,-1) 11(2.9,-0.6) 12(2.9,-0.2) 13(2.9,0.2) 14(2.9,0.6) 15(2.9,1) 16(2.9,1.4)
Top Overlay:
  circle w0.6: c-0.5,0.85 r0.3
  circle w0.25: c-2.9,2.1 r0.125
  lines w0.2: -1.5,-1.85 1.5,-1.85 1.5,1.85 -1.5,1.85 -1.5,-1.85
Mechanical 13:
  circle w0.1: c-1.35,0.95 r0.5
  lines w0.1: -2.25,-1.85 2.25,-1.85 2.25,1.85 -2.25,1.85 -2.25,-1.85
Mechanical 15:
  lines w0.1: -0.5,0 0.5,0 ; 0,-0.5 0,0.5 ; -4.4,-2.35 4.4,-2.35 4.4,2.35 -4.4,2.35 -4.4,-2.35
3D body: height 1.2, standoff 0, extent -2.25,-1.85 2.25,1.85